# Altium footprint library ST Microelectronics STM32 G4.PcbLib: 21 footprints (part 1 of 3) (continued)
## LQFP48-7x7mm [mil]
pads (48):
  rect 47x12 smd paste+0 mask+0: 1(-167.32,108.27) 2(-167.32,88.58) 3(-167.32,68.9) 4(-167.32,49.21) 5(-167.32,29.53) 6(-167.32,9.84) 7(-167.32,-9.84) 8(-167.32,-29.53) 9(-167.32,-49.21) 10(-167.32,-68.9) 11(-167.32,-88.58) 12(-167.32,-108.27) 25(167.32,-108.27) 26(167.32,-88.58) 27(167.32,-68.9) 28(167.32,-49.21) 29(167.32,-29.53) 30(167.32,-9.84) 31(167.32,9.84) 32(167.32,29.53) 33(167.32,49.21) 34(167.32,68.9) 35(167.32,88.58) 36(167.32,108.27)
  rect 12x47 smd paste+0 mask+0: 13(-108.27,-167.32) 14(-88.58,-167.32) 15(-68.9,-167.32) 16(-49.21,-167.32) 17(-29.53,-167.32) 18(-9.84,-167.32) 19(9.84,-167.32) 20(29.53,-167.32) 21(49.21,-167.32) 22(68.9,-167.32) 23(88.58,-167.32) 24(108.27,-167.32) 37(108.27,167.32) 38(88.58,167.32) 39(68.9,167.32) 40(49.21,167.32) 41(29.53,167.32) 42(9.84,167.32) 43(-9.84,167.32) 44(-29.53,167.32) 45(-49.21,167.32) 46(-68.9,167.32) 47(-88.58,167.32) 48(-108.27,167.32)
Top Overlay:
  circle w6: c-210.67,108.27 r3
  region: -200.82,-61.4 -210.82,-61.4 -210.82,-76.4 -200.82,-76.4
  region: 37.03,-200.82 22.03,-200.82 22.03,-210.82 37.03,-210.82
  region: 200.82,-2.34 210.82,-2.34 210.82,-17.34 200.82,-17.34
  region: 56.71,200.82 41.71,200.82 41.71,210.82 56.71,210.82
  lines w6: -146.5,-127.37 -146.5,-146.5 -127.37,-146.5 ; -146.5,127.37 -146.5,146.5 -127.37,146.5 ; 127.37,-146.5 146.5,-146.5 146.5,-127.37 ; 127.37,146.5 146.5,146.5 146.5,127.37
Mechanical 5:
  region: 215.82,-215.82 -215.82,-215.82 -215.82,215.82 215.82,215.82
Mechanical 7:
  lines w1: -288.32,-141.5 -108.27,-141.5 ; -288.32,141.5 -108.27,141.5 ; -250.82,88.58 -167.32,88.58 ; -250.82,108.27 -167.32,108.27 ; -235.82,38.58 -235.82,88.58 ; -235.82,158.27 -235.82,108.27 ; -167.32,-265.82 -167.32,-96.27 ; -141.5,-288.32 -141.5,-108.27 ; 120.27,-167.32 250.82,-167.32 ; 120.27,167.32 250.82,167.32 ; 141.5,-288.32 141.5,-108.27 ; 167.32,-265.82 167.32,-96.27 ; -273.32,-141.5 -273.32,141.5 ; -273.32,-141.5 -278.32,-131.5 -268.32,-131.5 -273.32,-141.5 ; -273.32,141.5 -278.32,131.5 -268.32,131.5 -273.32,141.5 ; -235.82,88.58 -240.82,78.58 -230.82,78.58 -235.82,88.58 ; -235.82,108.27 -240.82,118.27 -230.82,118.27 -235.82,108.27 ; -167.32,-250.82 167.32,-250.82 ; -167.32,-250.82 -157.32,-245.82 -157.32,-255.82 -167.32,-250.82 ; -141.5,-273.32 141.5,-273.32 ; -141.5,-273.32 -131.5,-268.32 -131.5,-278.32 -141.5,-273.32 ; 141.5,-273.32 131.5,-268.32 131.5,-278.32 141.5,-273.32 ; 167.32,-250.82 157.32,-245.82 157.32,-255.82 167.32,-250.82 ; 235.82,-167.32 235.82,167.32 ; 235.82,-167.32 230.82,-157.32 240.82,-157.32 235.82,-167.32 ; 235.82,167.32 230.82,157.32 240.82,157.32 235.82,167.32
  text "Default Padstyle: RX47Y12D0T" at -350,-450.82 h50
  text "Alt 1 Padstyle: OX60Y90D30P" at -337.5,-630.82 h50
  text "Alt 2 Padstyle: OX90Y60D30P" at -337.5,-690.82 h50
  text "0.02in/0.5mm" at -405.82,85.93 h25
  text "0.335in/8.5mm" at 255.82,-12.5 h25
  text "0.335in/8.5mm" at -81.25,-295.82 h25
  text "0.283in/7.188mm" at -93.75,-318.32 h25
  text "0.283in/7.188mm" at -480.82,-12.5 h25
Mechanical 13:
  circle w0: c-118.82,108.27 r3
  lines w1: -141.5,91.5 -91.5,141.5 ; -141.5,-141.5 141.5,-141.5 141.5,141.5 -141.5,141.5 -141.5,-141.5
Mechanical 15:
  region: -128.27,-151.5 -151.5,-151.5 -151.5,-128.27 -210.82,-128.27 -210.82,128.27 -151.5,128.27 -151.5,151.5 -128.27,151.5 -128.27,210.82 128.27,210.82 128.27,151.5 151.5,151.5 151.5,128.27 210.82,128.27 210.82,-128.27 151.5,-128.27 151.5,-151.5 128.27,-151.5 128.27,-210.82 -128.27,-210.82
  lines w6: -210.82,-128.27 -151.5,-128.27 -151.5,-151.5 -128.27,-151.5 -128.27,-210.82 128.27,-210.82 128.27,-151.5 151.5,-151.5 151.5,-128.27 210.82,-128.27 210.82,128.27 151.5,128.27 151.5,151.5 128.27,151.5 128.27,210.82 -128.27,210.82 -128.27,151.5 -151.5,151.5 -151.5,128.27 -210.82,128.27 -210.82,-128.27
3D body "LQFP48-7x7mm.step": height 63.11, standoff 0, extent -177.04,-177.04 177.05,177.05

## LQFP64-10x10mm [mil]
pads (64):
  rect 47x12 smd paste+0 mask+0: 1(-226.38,147.64) 2(-226.38,127.95) 3(-226.38,108.27) 4(-226.38,88.58) 5(-226.38,68.9) 6(-226.38,49.21) 7(-226.38,29.53) 8(-226.38,9.84) 9(-226.38,-9.84) 10(-226.38,-29.53) 11(-226.38,-49.21) 12(-226.38,-68.9) 13(-226.38,-88.58) 14(-226.38,-108.27) 15(-226.38,-127.95) 16(-226.38,-147.64) 33(226.38,-147.64) 34(226.38,-127.95) 35(226.38,-108.27) 36(226.38,-88.58) 37(226.38,-68.9) 38(226.38,-49.21) 39(226.38,-29.53) 40(226.38,-9.84) 41(226.38,9.84) 42(226.38,29.53) 43(226.38,49.21) 44(226.38,68.9) 45(226.38,88.58) 46(226.38,108.27) 47(226.38,127.95) 48(226.38,147.64)
  rect 12x47 smd paste+0 mask+0: 17(-147.64,-226.38) 18(-127.95,-226.38) 19(-108.27,-226.38) 20(-88.58,-226.38) 21(-68.9,-226.38) 22(-49.21,-226.38) 23(-29.53,-226.38) 24(-9.84,-226.38) 25(9.84,-226.38) 26(29.53,-226.38) 27(49.21,-226.38) 28(68.9,-226.38) 29(88.58,-226.38) 30(108.27,-226.38) 31(127.95,-226.38) 32(147.64,-226.38) 49(147.64,226.38) 50(127.95,226.38) 51(108.27,226.38) 52(88.58,226.38) 53(68.9,226.38) 54(49.21,226.38) 55(29.53,226.38) 56(9.84,226.38) 57(-9.84,226.38) 58(-29.53,226.38) 59(-49.21,226.38) 60(-68.9,226.38) 61(-88.58,226.38) 62(-108.27,226.38) 63(-127.95,226.38) 64(-147.64,226.38)
Top Overlay:
  circle w6: c-269.72,147.64 r3
  region: -259.88,-22.03 -269.88,-22.03 -269.88,-37.03 -259.88,-37.03
  region: -81.08,-259.88 -96.08,-259.88 -96.08,-269.88 -81.08,-269.88
  region: 115.77,-259.88 100.77,-259.88 100.77,-269.88 115.77,-269.88
  region: 259.88,-2.34 269.88,-2.34 269.88,-17.34 259.88,-17.34
  region: 135.45,259.88 120.45,259.88 120.45,269.88 135.45,269.88
  region: -61.4,259.88 -76.4,259.88 -76.4,269.88 -61.4,269.88
  lines w6: -202,-166.71 -202,-202 -166.71,-202 ; -202,166.71 -202,202 -166.71,202 ; 166.71,-202 202,-202 202,-166.71 ; 166.71,202 202,202 202,166.71
Mechanical 5:
  region: 274.88,-274.88 -274.88,-274.88 -274.88,274.88 274.88,274.88
Mechanical 7:
  lines w1: -347.38,-197 -147.64,-197 ; -347.38,197 -147.64,197 ; -309.88,127.95 -226.38,127.95 ; -309.88,147.64 -226.38,147.64 ; -294.88,77.95 -294.88,127.95 ; -294.88,197.64 -294.88,147.64 ; -226.38,-324.88 -226.38,-135.64 ; -197,-347.38 -197,-147.64 ; 159.64,-226.38 309.88,-226.38 ; 159.64,226.38 309.88,226.38 ; 197,-347.38 197,-147.64 ; 226.38,-324.88 226.38,-135.64 ; -332.38,-197 -332.38,197 ; -332.38,-197 -337.38,-187 -327.38,-187 -332.38,-197 ; -332.38,197 -337.38,187 -327.38,187 -332.38,197 ; -294.88,127.95 -299.88,117.95 -289.88,117.95 -294.88,127.95 ; -294.88,147.64 -299.88,157.64 -289.88,157.64 -294.88,147.64 ; -226.38,-309.88 226.38,-309.88 ; -226.38,-309.88 -216.38,-304.88 -216.38,-314.88 -226.38,-309.88 ; -197,-332.38 197,-332.38 ; -197,-332.38 -187,-327.38 -187,-337.38 -197,-332.38 ; 197,-332.38 187,-327.38 187,-337.38 197,-332.38 ; 226.38,-309.88 216.38,-304.88 216.38,-314.88 226.38,-309.88 ; 294.88,-226.38 294.88,226.38 ; 294.88,-226.38 289.88,-216.38 299.88,-216.38 294.88,-226.38 ; 294.88,226.38 289.88,216.38 299.88,216.38 294.88,226.38
  text "Default Padstyle: RX47Y12D0T" at -350,-509.88 h50
  text "Alt 1 Padstyle: OX60Y90D30P" at -337.5,-689.88 h50
  text "Alt 2 Padstyle: OX90Y60D30P" at -337.5,-749.88 h50
  text "0.02in/0.5mm" at -464.88,125.3 h25
  text "0.453in/11.5mm" at 314.88,-12.5 h25
  text "0.453in/11.5mm" at -87.5,-354.88 h25
  text "0.394in/10.008mm" at -100,-377.38 h25
  text "0.394in/10.008mm" at -552.38,-12.5 h25
Mechanical 13:
  circle w0: c-177.88,147.64 r3
  lines w1: -197,147 -147,197 ; -197,-197 197,-197 197,197 -197,197 -197,-197
Mechanical 15:
  region: -167.64,-207 -207,-207 -207,-167.64 -269.88,-167.64 -269.88,167.64 -207,167.64 -207,207 -167.64,207 -167.64,269.88 167.64,269.88 167.64,207 207,207 207,167.64 269.88,167.64 269.88,-167.64 207,-167.64 207,-207 167.64,-207 167.64,-269.88 -167.64,-269.88
  lines w6: -269.88,-167.64 -207,-167.64 -207,-207 -167.64,-207 -167.64,-269.88 167.64,-269.88 167.64,-207 207,-207 207,-167.64 269.88,-167.64 269.88,167.64 207,167.64 207,207 167.64,207 167.64,269.88 -167.64,269.88 -167.64,207 -207,207 -207,167.64 -269.88,167.64 -269.88,-167.64
3D body "LQFP64-10x10mm.step": height 63.11, standoff 0, extent -236.1,-236.1 236.11,236.11

## LQFP-32 [mil]
pads (32):
  rect 58x20 smd paste+0 mask+0: 1(-162,110.24) 2(-162,78.74) 3(-162,47.24) 4(-162,15.75) 5(-162,-15.75) 6(-162,-47.24) 7(-162,-78.74) 8(-162,-110.24) 17(162,-110.24) 18(162,-78.74) 19(162,-47.24) 20(162,-15.75) 21(162,15.75) 22(162,47.24) 23(162,78.74) 24(162,110.24)
  rect 20x58 smd paste+0 mask+0: 9(-110.24,-162) 10(-78.74,-162) 11(-47.24,-162) 12(-15.75,-162) 13(15.75,-162) 14(47.24,-162) 15(78.74,-162) 16(110.24,-162) 25(110.24,162) 26(78.74,162) 27(47.24,162) 28(15.75,162) 29(-15.75,162) 30(-47.24,162) 31(-78.74,162) 32(-110.24,162)
Top Overlay:
  region: -39.74,201 -54.74,201 -54.74,211 -39.74,211
  region: 201,-8.25 211,-8.25 211,-23.25 201,-23.25
  region: -71.24,-201 -86.24,-201 -86.24,-211 -71.24,-211
  text "*" at -228.5,115.98 h50
Mechanical 5:
  region: 216,-216 -216,-216 -216,216 216,216
Mechanical 7:
  lines w1: -292,-138 -110.24,-138 ; -292,138 -110.24,138 ; -177,110.24 -177,367 ; -138,-292 -138,-110.24 ; 97,277 147,277 ; 110.24,-177 367,-177 ; 110.24,177 367,177 ; 138,-292 138,-110.24 ; 147,110.24 147,292 ; 162,78.74 292,78.74 ; 162,110.24 292,110.24 ; 177,292 177,110.24 177,367 ; 227,277 177,277 ; 277,28.74 277,78.74 ; 277,160.24 277,110.24 ; -277,-138 -272,-128 -282,-128 -277,-138 ; -277,-138 -277,138 ; -277,138 -272,128 -282,128 -277,138 ; -177,352 -167,347 -167,357 -177,352 ; -177,352 177,352 ; -138,-277 -128,-282 -128,-272 -138,-277 ; -138,-277 138,-277 ; 138,-277 128,-282 128,-272 138,-277 ; 147,277 137,272 137,282 147,277 ; 177,277 187,272 187,282 177,277 ; 177,352 167,347 167,357 177,352 ; 277,78.74 282,68.74 272,68.74 277,78.74 ; 277,110.24 282,120.24 272,120.24 277,110.24 ; 352,-177 357,-167 347,-167 352,-177 ; 352,-177 352,177 ; 352,177 357,167 347,167 352,177
  text "0.354in/8.992mm" at 372,-12.5 h25
  text "0.276in/7.01mm" at -472,-12.5 h25
  text "0.276in/7.01mm" at -87.5,-322 h25
  text "0.354in/8.992mm" at -93.75,372 h25
  text "0.03in/0.762mm" at 74.5,297 h25
  text "0.031in/0.8mm" at 297,81.99 h25
  text "Alt 2 Padstyle: OX90Y60D30P" at -337.5,-727 h50
  text "Alt 1 Padstyle: OX60Y90D30P" at -337.5,-667 h50
  text "Default Vert Padstyle: RX20Y58D0T" at -412.5,-487 h50
  text "Default Horiz Padstyle: RX20Y58D0T" at -425,-427 h50
Mechanical 13:
  lines w1: -138,88 -88,138 ; -177,-119.24 -138,-119.24 -138,-101.24 -177,-101.24 -177,-119.24 ; -177,-87.74 -138,-87.74 -138,-69.74 -177,-69.74 -177,-87.74 ; -177,-56.24 -138,-56.24 -138,-38.24 -177,-38.24 -177,-56.24 ; -177,-24.75 -138,-24.75 -138,-6.75 -177,-6.75 -177,-24.75 ; -177,6.75 -138,6.75 -138,24.75 -177,24.75 -177,6.75 ; -177,38.24 -138,38.24 -138,56.24 -177,56.24 -177,38.24 ; -177,69.74 -138,69.74 -138,87.74 -177,87.74 -177,69.74 ; -177,101.24 -138,101.24 -138,119.24 -177,119.24 -177,101.24 ; -138,-138 -138,138 138,138 138,-138 -138,-138 ; -119.24,-177 -101.24,-177 -101.24,-138 -119.24,-138 -119.24,-177 ; -119.24,138 -119.24,177 -101.24,177 -101.24,138 -119.24,138 ; -87.74,-177 -69.74,-177 -69.74,-138 -87.74,-138 -87.74,-177 ; -87.74,138 -87.74,177 -69.74,177 -69.74,138 -87.74,138 ; -56.24,-177 -38.24,-177 -38.24,-138 -56.24,-138 -56.24,-177 ; -56.24,138 -56.24,177 -38.24,177 -38.24,138 -56.24,138 ; -24.75,-177 -6.75,-177 -6.75,-138 -24.75,-138 -24.75,-177 ; -24.75,138 -24.75,177 -6.75,177 -6.75,138 -24.75,138 ; 6.75,-177 24.75,-177 24.75,-138 6.75,-138 6.75,-177 ; 6.75,138 6.75,177 24.75,177 24.75,138 6.75,138 ; 38.24,-177 56.24,-177 56.24,-138 38.24,-138 38.24,-177 ; 38.24,138 38.24,177 56.24,177 56.24,138 38.24,138 ; 69.74,-177 87.74,-177 87.74,-138 69.74,-138 69.74,-177 ; 69.74,138 69.74,177 87.74,177 87.74,138 69.74,138 ; 101.24,-177 119.24,-177 119.24,-138 101.24,-138 101.24,-177 ; 101.24,138 101.24,177 119.24,177 119.24,138 101.24,138 ; 138,-119.24 177,-119.24 177,-101.24 138,-101.24 138,-119.24 ; 138,-87.74 177,-87.74 177,-69.74 138,-69.74 138,-87.74 ; 138,-56.24 177,-56.24 177,-38.24 138,-38.24 138,-56.24 ; 138,-24.75 177,-24.75 177,-6.75 138,-6.75 138,-24.75 ; 138,6.75 177,6.75 177,24.75 138,24.75 138,6.75 ; 138,38.24 177,38.24 177,56.24 138,56.24 138,38.24 ; 138,69.74 177,69.74 177,87.74 138,87.74 138,69.74 ; 138,101.24 177,101.24 177,119.24 138,119.24 138,101.24
  text "*" at -135.5,100.98 h50
Mechanical 15:
  region: -130.24,-148 -148,-148 -148,-130.24 -201,-130.24 -201,130.24 -148,130.24 -148,148 -130.24,148 -130.24,201 130.24,201 130.24,148 148,148 148,130.24 201,130.24 201,-130.24 148,-130.24 148,-148 130.24,-148 130.24,-201 -130.24,-201
  lines w6: -201,-130.24 -201,130.24 -148,130.24 -148,148 -130.24,148 -130.24,201 130.24,201 130.24,148 148,148 148,130.24 201,130.24 201,-130.24 148,-130.24 148,-148 130.24,-148 130.24,-201 -130.24,-201 -130.24,-148 -148,-148 -148,-130.24 -201,-130.24
3D body "LQFP-32.step": height 63.11, standoff 0, extent -177,-177 177.01,177.01

## LQFP-32-L [mil]
pads (32):
  rect 46x18 smd paste+0 mask+0: 1(-160,110.24) 2(-160,78.74) 3(-160,47.24) 4(-160,15.75) 5(-160,-15.75) 6(-160,-47.24) 7(-160,-78.74) 8(-160,-110.24) 17(160,-110.24) 18(160,-78.74) 19(160,-47.24) 20(160,-15.75) 21(160,15.75) 22(160,47.24) 23(160,78.74) 24(160,110.24)
  rect 18x46 smd paste+0 mask+0: 9(-110.24,-160) 10(-78.74,-160) 11(-47.24,-160) 12(-15.75,-160) 13(15.75,-160) 14(47.24,-160) 15(78.74,-160) 16(110.24,-160) 25(110.24,160) 26(78.74,160) 27(47.24,160) 28(15.75,160) 29(-15.75,160) 30(-47.24,160) 31(-78.74,160) 32(-110.24,160)
Top Overlay:
  region: -39.74,193 -54.74,193 -54.74,203 -39.74,203
  region: 193,-8.25 203,-8.25 203,-23.25 193,-23.25
  region: -71.24,-193 -86.24,-193 -86.24,-203 -71.24,-203
  lines w6: -143,-132.34 -143,-143 -132.34,-143 ; -143,132.34 -143,143 -132.34,143 ; 132.34,-143 143,-143 143,-132.34 ; 132.34,143 143,143 143,132.34
  text "*" at -220.5,115.98 h50
Mechanical 5:
  region: 202,-202 -202,-202 -202,202 202,202
Mechanical 7:
  lines w1: -290,-138 -110.24,-138 ; -290,138 -110.24,138 ; -177,110.24 -177,365 ; -138,-290 -138,-110.24 ; 97,275 147,275 ; 110.24,-177 365,-177 ; 110.24,177 365,177 ; 138,-290 138,-110.24 ; 147,110.24 147,290 ; 160,78.74 290,78.74 ; 160,110.24 290,110.24 ; 177,290 177,110.24 177,365 ; 227,275 177,275 ; 275,28.74 275,78.74 ; 275,160.24 275,110.24 ; -275,-138 -270,-128 -280,-128 -275,-138 ; -275,-138 -275,138 ; -275,138 -270,128 -280,128 -275,138 ; -177,350 -167,345 -167,355 -177,350 ; -177,350 177,350 ; -138,-275 -128,-280 -128,-270 -138,-275 ; -138,-275 138,-275 ; 138,-275 128,-280 128,-270 138,-275 ; 147,275 137,270 137,280 147,275 ; 177,275 187,270 187,280 177,275 ; 177,350 167,345 167,355 177,350 ; 275,78.74 280,68.74 270,68.74 275,78.74 ; 275,110.24 280,120.24 270,120.24 275,110.24 ; 350,-177 355,-167 345,-167 350,-177 ; 350,-177 350,177 ; 350,177 355,167 345,167 350,177
  text "0.354in/8.992mm" at 370,-12.5 h25
  text "0.276in/7.01mm" at -470,-12.5 h25
  text "0.276in/7.01mm" at -87.5,-320 h25
  text "0.354in/8.992mm" at -93.75,370 h25
  text "0.03in/0.762mm" at 74.5,295 h25
  text "0.031in/0.8mm" at 295,81.99 h25
  text "Alt 2 Padstyle: OX90Y60D30P" at -337.5,-725 h50
  text "Alt 1 Padstyle: OX60Y90D30P" at -337.5,-665 h50
  text "Default Vert Padstyle: RX18Y46D0T" at -412.5,-485 h50
  text "Default Horiz Padstyle: RX18Y46D0T" at -425,-425 h50
Mechanical 13:
  lines w1: -138,88 -88,138 ; -177,-119.24 -138,-119.24 -138,-101.24 -177,-101.24 -177,-119.24 ; -177,-87.74 -138,-87.74 -138,-69.74 -177,-69.74 -177,-87.74 ; -177,-56.24 -138,-56.24 -138,-38.24 -177,-38.24 -177,-56.24 ; -177,-24.75 -138,-24.75 -138,-6.75 -177,-6.75 -177,-24.75 ; -177,6.75 -138,6.75 -138,24.75 -177,24.75 -177,6.75 ; -177,38.24 -138,38.24 -138,56.24 -177,56.24 -177,38.24 ; -177,69.74 -138,69.74 -138,87.74 -177,87.74 -177,69.74 ; -177,101.24 -138,101.24 -138,119.24 -177,119.24 -177,101.24 ; -138,-138 -138,138 138,138 138,-138 -138,-138 ; -119.24,-177 -101.24,-177 -101.24,-138 -119.24,-138 -119.24,-177 ; -119.24,138 -119.24,177 -101.24,177 -101.24,138 -119.24,138 ; -87.74,-177 -69.74,-177 -69.74,-138 -87.74,-138 -87.74,-177 ; -87.74,138 -87.74,177 -69.74,177 -69.74,138 -87.74,138 ; -56.24,-177 -38.24,-177 -38.24,-138 -56.24,-138 -56.24,-177 ; -56.24,138 -56.24,177 -38.24,177 -38.24,138 -56.24,138 ; -24.75,-177 -6.75,-177 -6.75,-138 -24.75,-138 -24.75,-177 ; -24.75,138 -24.75,177 -6.75,177 -6.75,138 -24.75,138 ; 6.75,-177 24.75,-177 24.75,-138 6.75,-138 6.75,-177 ; 6.75,138 6.75,177 24.75,177 24.75,138 6.75,138 ; 38.24,-177 56.24,-177 56.24,-138 38.24,-138 38.24,-177 ; 38.24,138 38.24,177 56.24,177 56.24,138 38.24,138 ; 69.74,-177 87.74,-177 87.74,-138 69.74,-138 69.74,-177 ; 69.74,138 69.74,177 87.74,177 87.74,138 69.74,138 ; 101.24,-177 119.24,-177 119.24,-138 101.24,-138 101.24,-177 ; 101.24,138 101.24,177 119.24,177 119.24,138 101.24,138 ; 138,-119.24 177,-119.24 177,-101.24 138,-101.24 138,-119.24 ; 138,-87.74 177,-87.74 177,-69.74 138,-69.74 138,-87.74 ; 138,-56.24 177,-56.24 177,-38.24 138,-38.24 138,-56.24 ; 138,-24.75 177,-24.75 177,-6.75 138,-6.75 138,-24.75 ; 138,6.75 177,6.75 177,24.75 138,24.75 138,6.75 ; 138,38.24 177,38.24 177,56.24 138,56.24 138,38.24 ; 138,69.74 177,69.74 177,87.74 138,87.74 138,69.74 ; 138,101.24 177,101.24 177,119.24 138,119.24 138,101.24
  text "*" at -135.5,100.98 h50
Mechanical 15:
  region: -123.24,-142 -142,-142 -142,-123.24 -187,-123.24 -187,123.24 -142,123.24 -142,142 -123.24,142 -123.24,187 123.24,187 123.24,142 142,142 142,123.24 187,123.24 187,-123.24 142,-123.24 142,-142 123.24,-142 123.24,-187 -123.24,-187
  lines w6: -187,-123.24 -187,123.24 -142,123.24 -142,142 -123.24,142 -123.24,187 123.24,187 123.24,142 142,142 142,123.24 187,123.24 187,-123.24 142,-123.24 142,-142 123.24,-142 123.24,-187 -123.24,-187 -123.24,-142 -142,-142 -142,-123.24 -187,-123.24
3D body "LQFP-32-L.step": height 63.11, standoff 0, extent -177,-177 177.02,177.01

## LQFP-32-M [mil]
pads (32):
  rect 70x22 smd paste+0 mask+0: 1(-164,110.24) 2(-164,78.74) 3(-164,47.24) 4(-164,15.75) 5(-164,-15.75) 6(-164,-47.24) 7(-164,-78.74) 8(-164,-110.24) 17(164,-110.24) 18(164,-78.74) 19(164,-47.24) 20(164,-15.75) 21(164,15.75) 22(164,47.24) 23(164,78.74) 24(164,110.24)
  rect 22x70 smd paste+0 mask+0: 9(-110.24,-164) 10(-78.74,-164) 11(-47.24,-164) 12(-15.75,-164) 13(15.75,-164) 14(47.24,-164) 15(78.74,-164) 16(110.24,-164) 25(110.24,164) 26(78.74,164) 27(47.24,164) 28(15.75,164) 29(-15.75,164) 30(-47.24,164) 31(-78.74,164) 32(-110.24,164)
Top Overlay:
  region: -71.24,-209 -86.24,-209 -86.24,-219 -71.24,-219
  region: 209,-8.25 219,-8.25 219,-23.25 209,-23.25
  region: -39.74,209 -54.74,209 -54.74,219 -39.74,219
  text "*" at -236.5,115.98 h50
Mechanical 5:
  region: 234,-234 -234,-234 -234,234 234,234
Mechanical 7:
  lines w1: -294,-138 -110.24,-138 ; -294,138 -110.24,138 ; -177,110.24 -177,369 ; -138,-294 -138,-110.24 ; 97,279 147,279 ; 110.24,-177 369,-177 ; 110.24,177 369,177 ; 138,-294 138,-110.24 ; 147,110.24 147,294 ; 164,78.74 294,78.74 ; 164,110.24 294,110.24 ; 177,294 177,110.24 177,369 ; 227,279 177,279 ; 279,28.74 279,78.74 ; 279,160.24 279,110.24 ; -279,-138 -279,138 ; -279,-138 -284,-128 -274,-128 -279,-138 ; -279,138 -284,128 -274,128 -279,138 ; -177,354 177,354 ; -177,354 -167,359 -167,349 -177,354 ; -138,-279 138,-279 ; -138,-279 -128,-274 -128,-284 -138,-279 ; 138,-279 128,-274 128,-284 138,-279 ; 147,279 137,284 137,274 147,279 ; 177,279 187,284 187,274 177,279 ; 177,354 167,359 167,349 177,354 ; 279,78.74 274,68.74 284,68.74 279,78.74 ; 279,110.24 274,120.24 284,120.24 279,110.24 ; 354,-177 354,177 ; 354,-177 349,-167 359,-167 354,-177 ; 354,177 349,167 359,167 354,177
  text "Default Horiz Padstyle: RX22Y70D0T" at -425,-429 h50
  text "Default Vert Padstyle: RX22Y70D0T" at -412.5,-489 h50
  text "Alt 1 Padstyle: OX60Y90D30P" at -337.5,-669 h50
  text "Alt 2 Padstyle: OX90Y60D30P" at -337.5,-729 h50
  text "0.031in/0.8mm" at 299,81.99 h25
  text "0.03in/0.762mm" at 74.5,299 h25
  text "0.354in/8.992mm" at -93.75,374 h25
  text "0.276in/7.01mm" at -87.5,-324 h25
  text "0.276in/7.01mm" at -474,-12.5 h25
  text "0.354in/8.992mm" at 374,-12.5 h25
Mechanical 13:
  lines w1: -138,88 -88,138 ; -177,-119.24 -177,-101.24 -138,-101.24 -138,-119.24 -177,-119.24 ; -177,-87.74 -177,-69.74 -138,-69.74 -138,-87.74 -177,-87.74 ; -177,-56.24 -177,-38.24 -138,-38.24 -138,-56.24 -177,-56.24 ; -177,-24.75 -177,-6.75 -138,-6.75 -138,-24.75 -177,-24.75 ; -177,6.75 -177,24.75 -138,24.75 -138,6.75 -177,6.75 ; -177,38.24 -177,56.24 -138,56.24 -138,38.24 -177,38.24 ; -177,69.74 -177,87.74 -138,87.74 -138,69.74 -177,69.74 ; -177,101.24 -177,119.24 -138,119.24 -138,101.24 -177,101.24 ; -138,-138 138,-138 138,138 -138,138 -138,-138 ; -119.24,-177 -119.24,-138 -101.24,-138 -101.24,-177 -119.24,-177 ; -119.24,138 -101.24,138 -101.24,177 -119.24,177 -119.24,138 ; -87.74,-177 -87.74,-138 -69.74,-138 -69.74,-177 -87.74,-177 ; -87.74,138 -69.74,138 -69.74,177 -87.74,177 -87.74,138 ; -56.24,-177 -56.24,-138 -38.24,-138 -38.24,-177 -56.24,-177 ; -56.24,138 -38.24,138 -38.24,177 -56.24,177 -56.24,138 ; -24.75,-177 -24.75,-138 -6.75,-138 -6.75,-177 -24.75,-177 ; -24.75,138 -6.75,138 -6.75,177 -24.75,177 -24.75,138 ; 6.75,-177 6.75,-138 24.75,-138 24.75,-177 6.75,-177 ; 6.75,138 24.75,138 24.75,177 6.75,177 6.75,138 ; 38.24,-177 38.24,-138 56.24,-138 56.24,-177 38.24,-177 ; 38.24,138 56.24,138 56.24,177 38.24,177 38.24,138 ; 69.74,-177 69.74,-138 87.74,-138 87.74,-177 69.74,-177 ; 69.74,138 87.74,138 87.74,177 69.74,177 69.74,138 ; 101.24,-177 101.24,-138 119.24,-138 119.24,-177 101.24,-177 ; 101.24,138 119.24,138 119.24,177 101.24,177 101.24,138 ; 138,-119.24 138,-101.24 177,-101.24 177,-119.24 138,-119.24 ; 138,-87.74 138,-69.74 177,-69.74 177,-87.74 138,-87.74 ; 138,-56.24 138,-38.24 177,-38.24 177,-56.24 138,-56.24 ; 138,-24.75 138,-6.75 177,-6.75 177,-24.75 138,-24.75 ; 138,6.75 138,24.75 177,24.75 177,6.75 138,6.75 ; 138,38.24 138,56.24 177,56.24 177,38.24 138,38.24 ; 138,69.74 138,87.74 177,87.74 177,69.74 138,69.74 ; 138,101.24 138,119.24 177,119.24 177,101.24 138,101.24
  text "*" at -135.5,100.98 h50
Mechanical 15:
  region: -141.24,-158 -158,-158 -158,-141.24 -219,-141.24 -219,141.24 -158,141.24 -158,158 -141.24,158 -141.24,219 141.24,219 141.24,158 158,158 158,141.24 219,141.24 219,-141.24 158,-141.24 158,-158 141.24,-158 141.24,-219 -141.24,-219
  lines w6: -219,-141.24 -158,-141.24 -158,-158 -141.24,-158 -141.24,-219 141.24,-219 141.24,-158 158,-158 158,-141.24 219,-141.24 219,141.24 158,141.24 158,158 141.24,158 141.24,219 -141.24,219 -141.24,158 -158,158 -158,141.24 -219,141.24 -219,-141.24
3D body "LQFP-32-M.step": height 63.11, standoff 0, extent -177,-177 177.02,177.02

## LQFP-80 [mil]
pads (56):
  rect 57.5x17 smd paste+0 mask+0: 1(-304.15,166.4) 2(-304.15,140.8) 3(-304.15,115.2) 4(-304.15,89.6) 5(-304.15,64) 6(-304.15,38.4) 7(-304.15,12.8) 8(-304.15,-12.8) 9(-304.15,-38.4) 10(-304.15,-64) 11(-304.15,-89.6) 12(-304.15,-115.2) 13(-304.15,-140.8) 14(-304.15,-166.4) 29(304.15,-166.4) 30(304.15,-140.8) 31(304.15,-115.2) 32(304.15,-89.6) 33(304.15,-64) 34(304.15,-38.4) 35(304.15,-12.8) 36(304.15,12.8) 37(304.15,38.4) 38(304.15,64) 39(304.15,89.6) 40(304.15,115.2) 41(304.15,140.8) 42(304.15,166.4)
  rect 17x57.5 smd paste+0 mask+0: 15(-166.4,-304.15) 16(-140.8,-304.15) 17(-115.2,-304.15) 18(-89.6,-304.15) 19(-64,-304.15) 20(-38.4,-304.15) 21(-12.8,-304.15) 22(12.8,-304.15) 23(38.4,-304.15) 24(64,-304.15) 25(89.6,-304.15) 26(115.2,-304.15) 27(140.8,-304.15) 28(166.4,-304.15) 43(166.4,304.15) 44(140.8,304.15) 45(115.2,304.15) 46(89.6,304.15) 47(64,304.15) 48(38.4,304.15) 49(12.8,304.15) 50(-12.8,304.15) 51(-38.4,304.15) 52(-64,304.15) 53(-89.6,304.15) 54(-115.2,304.15) 55(-140.8,304.15) 56(-166.4,304.15)
Top Overlay:
  region: -5.3,342.9 -20.3,342.9 -20.3,352.9 -5.3,352.9
  region: 342.9,122.7 352.9,122.7 352.9,107.7 342.9,107.7
  region: 342.9,-133.3 352.9,-133.3 352.9,-148.3 342.9,-148.3
  region: -30.9,-342.9 -45.9,-342.9 -45.9,-352.9 -30.9,-352.9
  region: -342.9,-56.5 -352.9,-56.5 -352.9,-71.5 -342.9,-71.5
  lines w6: -284.55,-188 -284.55,-284.55 -188,-284.55 ; -284.55,188 -284.55,284.55 -188,284.55 ; 188,-284.55 284.55,-284.55 284.55,-188 ; 188,284.55 284.55,284.55 284.55,188
  text "*" at -370.4,169.2 h50
Mechanical 5:
  region: 357.9,-357.9 -357.9,-357.9 -357.9,357.9 357.9,357.9
Mechanical 7:
  lines w1: -433.9,-279.55 -166.4,-279.55 ; -433.9,279.55 -166.4,279.55 ; -318.9,166.4 -318.9,508.9 ; -279.55,-433.9 -279.55,-166.4 ; 166.4,-318.9 508.9,-318.9 ; 166.4,318.9 508.9,318.9 ; 239.4,418.9 289.4,418.9 ; 279.55,-433.9 279.55,-166.4 ; 289.4,166.4 289.4,433.9 ; 304.15,140.8 433.9,140.8 ; 304.15,166.4 433.9,166.4 ; 318.9,433.9 318.9,166.4 318.9,508.9 ; 368.9,418.9 318.9,418.9 ; 418.9,90.8 418.9,140.8 ; 418.9,216.4 418.9,166.4 ; -418.9,-279.55 -413.9,-269.55 -423.9,-269.55 -418.9,-279.55 ; -418.9,-279.55 -418.9,279.55 ; -418.9,279.55 -413.9,269.55 -423.9,269.55 -418.9,279.55 ; -318.9,493.9 -308.9,488.9 -308.9,498.9 -318.9,493.9 ; -318.9,493.9 318.9,493.9 ; -279.55,-418.9 -269.55,-423.9 -269.55,-413.9 -279.55,-418.9 ; -279.55,-418.9 279.55,-418.9 ; 279.55,-418.9 269.55,-423.9 269.55,-413.9 279.55,-418.9 ; 289.4,418.9 279.4,413.9 279.4,423.9 289.4,418.9 ; 318.9,418.9 328.9,413.9 328.9,423.9 318.9,418.9 ; 318.9,493.9 308.9,488.9 308.9,498.9 318.9,493.9 ; 418.9,140.8 423.9,130.8 413.9,130.8 418.9,140.8 ; 418.9,166.4 423.9,176.4 413.9,176.4 418.9,166.4 ; 493.9,-318.9 498.9,-308.9 488.9,-308.9 493.9,-318.9 ; 493.9,-318.9 493.9,318.9 ; 493.9,318.9 498.9,308.9 488.9,308.9 493.9,318.9
  text "0.638in/16.2mm" at 513.9,-12.5 h25
  text "0.559in/14.201mm" at -638.9,-12.5 h25
  text "0.559in/14.201mm" at -100,-463.9 h25
  text "0.638in/16.2mm" at -87.5,513.9 h25
  text "0.03in/0.749mm" at 216.65,438.9 h25
  text "0.026in/0.65mm" at 438.9,141.1 h25
  text "Alt 2 Padstyle: OX90Y60D30P" at -337.5,-868.9 h50
  text "Alt 1 Padstyle: OX60Y90D30P" at -337.5,-808.9 h50
  text "Default Vert Padstyle: RX17Y57p5D0T" at -437.5,-628.9 h50
  text "Default Horiz Padstyle: RX17Y57p5D0T" at -450,-568.9 h50
Mechanical 13:
  drawing of 229 lines, arcs and shapes, not listed
  text "*" at -277.05,154.2 h50
Mechanical 15:
  region: -184.9,-289.55 -289.55,-289.55 -289.55,-184.9 -342.9,-184.9 -342.9,184.9 -289.55,184.9 -289.55,289.55 -184.9,289.55 -184.9,342.9 184.9,342.9 184.9,289.55 289.55,289.55 289.55,184.9 342.9,184.9 342.9,-184.9 289.55,-184.9 289.55,-289.55 184.9,-289.55 184.9,-342.9 -184.9,-342.9
  lines w6: -342.9,-184.9 -342.9,184.9 -289.55,184.9 -289.55,289.55 -184.9,289.55 -184.9,342.9 184.9,342.9 184.9,289.55 289.55,289.55 289.55,184.9 342.9,184.9 342.9,-184.9 289.55,-184.9 289.55,-289.55 184.9,-289.55 184.9,-342.9 -184.9,-342.9 -184.9,-289.55 -289.55,-289.55 -289.55,-184.9 -342.9,-184.9
3D body "LQFP-80.step": height 63.11, standoff 0, extent -318.89,-318.89 318.9,318.9